# Altium footprint library csy.PcbLib: 198 footprints (part 13 of 13)
Each footprint in its own frame and in the unit in brackets; x right, y up, seen from the top. Pads: shape width x height; smd on the part's side, far side on the other; paste and mask are expansions set on the pad; w line width, h text height; cw(c..) or ccw(c..) is an arc to the next point about the centre after c.
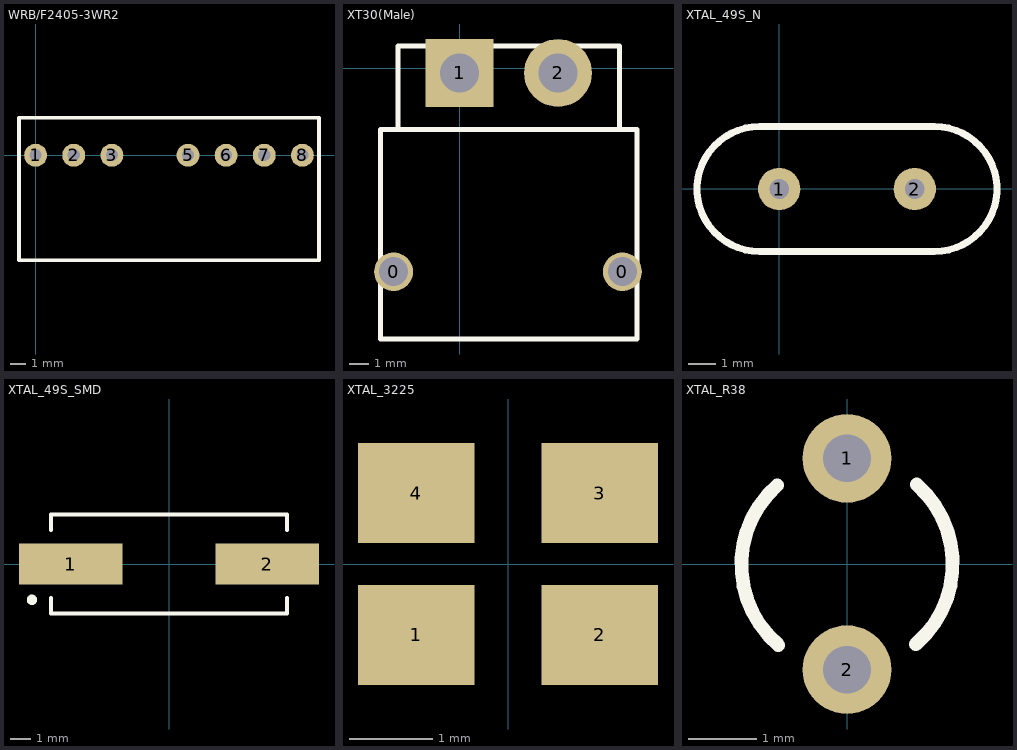
[diagram p12: the footprints below, top view; thin cyan lines are the x and y axes]

## WRB/F2405-3WR2 [mil]
pads (7):
  round 60 hole 31.5: 1(0,0) 2(100,0) 3(200,0) 5(400,0) 6(500,0) 7(600,0) 8(700,0)
Top Overlay:
  lines w10: -43.7,-275.59 -43.7,98.43 743.7,98.43 743.7,-275.59 -43.7,-275.59
3D body "WRB2405.STEP": height 476.38, standoff -157.48, extent -83.07,-274.4 783.08,100.01

## XT30(Male) [mm] "XT30公头"
height 5
pads (4):
  round 2 hole 1.5: 0(-3.4,-10.5) 0(8.4,-10.5)
  rect 3.5x3.5 hole 2: 1(0,-0.254)
  round 3.5 hole 2: 2(5.08,-0.254)
Top Overlay:
  lines w0.254: -3.175,-3.175 -3.175,1.143 8.255,1.143 8.255,-3.175 ; -3.175,-3.175 8.255,-3.175 ; -3.175,-3.175 -4.064,-3.175 -4.064,-13.97 9.144,-13.97 9.144,-3.175 8.255,-3.175
3D body "User Library-XT30- curved.STEP": height 5, standoff -2.1, extent -4.11,-13.99 9.19,1.016

## XTAL_49S_N [mil]
pads (2):
  round 60 hole 28: 1(0,0) 2(192,0)
Top Overlay:
  lines w10: -28,-88.5 cw(c-28,0) -28,88.5 220,88.5 cw(c220,0) 220,-88.5 -28,-88.5
3D body "hc-49s_n.stp": height 157.48, standoff -98.43, extent -116.14,-89.37 309.06,87.8

## XTAL_49S_SMD [mm]
pads (2):
  rect 5x2 smd: 1(-4.75,0) 2(4.75,0)
Top Overlay:
  circle w0.25: c-6.625,-1.73 r0.125
  lines w0.2: -5.7,-1.65 -5.7,-2.4 5.7,-2.4 5.7,-1.65 ; -5.7,1.65 -5.7,2.4 5.7,2.4 5.7,1.65
3D body "User Library-hc49_cystal.STEP": height 4, standoff 0, extent -6.7,-2.462 6.7,2.438

## XTAL_3225 [mm]
pads (4):
  rect 1.4x1.2 smd: 1(-1.1,-0.85) 2(1.1,-0.85) 3(1.1,0.85) 4(-1.1,0.85)
3D body "晶阵.STEP": height 0.7, standoff 0, extent -1.6,-1.25 1.6,1.25

## XTAL_R38 [mm] "Crystal, Thru-Hole; 2 Leads; Body 3.1 x 8.2 mm (Dia.xH)"
height 8.2
pads (2):
  round 1.3 hole 0.7: 1(0,1.55) 2(0,-1.55)
Top Overlay:
  lines w0.2: -1.022,1.155 ccw(c0,-0.01) -1.006,-1.189 ; 1.006,-1.179 ccw(c0,0) 1.022,1.165